# Altium footprint library Connectors THD.PcbLib: 631 footprints (part 15 of 46) (continued)
## HARTING_02 02 160 2301 [mm] "Backplane Connector; Har-bus 64, 17mm Pres-in Terminations; Rows z+a+b+c+d, Press-in 160 Female Contacts" (continued)
  text "d" at 6.475,-0.45 h1.2
  text "c" at 2.275,1.425 h1.2
  text "z" at -5.725,1.375 h1.2
  text "a" at -3.14,1.39 h1.2
  text "b" at -0.425,1.4 h1.2
  text "30" at -10.575,-74.3 h1.2
  text "25" at -10.625,-61.6 h1.2
  text "20" at -10.575,-48.875 h1.2
  text "15" at -10.395,-36.185 h1.2
  text "10" at -10.395,-23.485 h1.2
  text "5" at -9.525,-10.795 h1.2
  text "32" at -10.6,-79.375 h1.2
  text "1" at -9.07,-0.675 h1.2
Drill Drawing:
  lines w0.1: -7.62,-58.42 -7.62,-81.28 7.62,-81.28 7.62,2.54 -7.62,2.54 -7.62,-20.32
  text "PRESS-FIT TECHNOLOGY diam. 1mm +0.1 -0" at -6.985,-56.515 h1
3D body: height 11.6, standoff -17, extent -8,-86.82 8,8.08

## HARTING_02 04 160 1101 [mm] "PCB connector, DIN 41612, har-bus 64, 160 poles, Angled solder pins, 3.0 mm, Male contacts, Four first mating contacts, Performance level 2 as per IEC 60603-2, Row pitch: 2.54 mm, Without fixing"
height 10.7
pads (162):
  round 1.5 hole 1: a1(-2.54,-78.74) a2(-2.54,-76.2) a3(-2.54,-73.66) a4(-2.54,-71.12) a5(-2.54,-68.58) a6(-2.54,-66.04) a7(-2.54,-63.5) a8(-2.54,-60.96) a9(-2.54,-58.42) a10(-2.54,-55.88) a11(-2.54,-53.34) a12(-2.54,-50.8) a13(-2.54,-48.26) a14(-2.54,-45.72) a15(-2.54,-43.18) a16(-2.54,-40.64) a17(-2.54,-38.1) a18(-2.54,-35.56) a19(-2.54,-33.02) a20(-2.54,-30.48) a21(-2.54,-27.94) a22(-2.54,-25.4) a23(-2.54,-22.86) a24(-2.54,-20.32) a25(-2.54,-17.78) a26(-2.54,-15.24) a27(-2.54,-12.7) a28(-2.54,-10.16) a29(-2.54,-7.62) a30(-2.54,-5.08) a31(-2.54,-2.54) a32(-2.54,0) b1(-5.08,-78.74) b2(-5.08,-76.2) b3(-5.08,-73.66) b4(-5.08,-71.12) b5(-5.08,-68.58) b6(-5.08,-66.04) b7(-5.08,-63.5) b8(-5.08,-60.96) b9(-5.08,-58.42) b10(-5.08,-55.88) b11(-5.08,-53.34) b12(-5.08,-50.8) b13(-5.08,-48.26) b14(-5.08,-45.72) b15(-5.08,-43.18) b16(-5.08,-40.64) b17(-5.08,-38.1) b18(-5.08,-35.56) b19(-5.08,-33.02) b20(-5.08,-30.48) b21(-5.08,-27.94) b22(-5.08,-25.4) b23(-5.08,-22.86) b24(-5.08,-20.32) b25(-5.08,-17.78) b26(-5.08,-15.24) b27(-5.08,-12.7) b28(-5.08,-10.16) b29(-5.08,-7.62) b30(-5.08,-5.08) b31(-5.08,-2.54) b32(-5.08,0) c1(-7.62,-78.74) c2(-7.62,-76.2) c3(-7.62,-73.66) c4(-7.62,-71.12) c5(-7.62,-68.58) c6(-7.62,-66.04) c7(-7.62,-63.5) c8(-7.62,-60.96) c9(-7.62,-58.42) c10(-7.62,-55.88) c11(-7.62,-53.34) c12(-7.62,-50.8) c13(-7.62,-48.26) c14(-7.62,-45.72) c15(-7.62,-43.18) c16(-7.62,-40.64) c17(-7.62,-38.1) c18(-7.62,-35.56) c19(-7.62,-33.02) c20(-7.62,-30.48) c21(-7.62,-27.94) c22(-7.62,-25.4) c23(-7.62,-22.86) c24(-7.62,-20.32) c25(-7.62,-17.78) c26(-7.62,-15.24) c27(-7.62,-12.7) c28(-7.62,-10.16) c29(-7.62,-7.62) c30(-7.62,-5.08) c31(-7.62,-2.54) c32(-7.62,0) d1(-10.16,-78.74) d2(-10.16,-76.2) d3(-10.16,-73.66) d4(-10.16,-71.12) d5(-10.16,-68.58) d6(-10.16,-66.04) d7(-10.16,-63.5) d8(-10.16,-60.96) d9(-10.16,-58.42) d10(-10.16,-55.88) d11(-10.16,-53.34) d12(-10.16,-50.8) d13(-10.16,-48.26) d14(-10.16,-45.72) d15(-10.16,-43.18) d16(-10.16,-40.64) d17(-10.16,-38.1) d18(-10.16,-35.56) d19(-10.16,-33.02) d20(-10.16,-30.48) d21(-10.16,-27.94) d22(-10.16,-25.4) d23(-10.16,-22.86) d24(-10.16,-20.32) d25(-10.16,-17.78) d26(-10.16,-15.24) d27(-10.16,-12.7) d28(-10.16,-10.16) d29(-10.16,-7.62) d30(-10.16,-5.08) d31(-10.16,-2.54) d32(-10.16,0) z1(0,-78.74) z2(0,-76.2) z3(0,-73.66) z4(0,-71.12) z5(0,-68.58) z6(0,-66.04) z7(0,-63.5) z8(0,-60.96) z9(0,-58.42) z10(0,-55.88) z11(0,-53.34) z12(0,-50.8) z13(0,-48.26) z14(0,-45.72) z15(0,-43.18) z16(0,-40.64) z17(0,-38.1) z18(0,-35.56) z19(0,-33.02) z20(0,-30.48) z21(0,-27.94) z22(0,-25.4) z23(0,-22.86) z24(0,-20.32) z25(0,-17.78) z26(0,-15.24) z27(0,-12.7) z28(0,-10.16) z29(0,-7.62) z30(0,-5.08) z31(0,-2.54) z32(0,0)
  round 3.5 / inner round 3.5 / far side round 5.1 hole 2.8: MTG1(0,5.08) MTG2(0,-83.82)
Top Overlay:
  lines w0.2: -6.4,-83.82 -2.944,-83.82 ; -6.4,-80.77 -12.3,-80.77 -12.3,1.53 -6.4,1.53 ; -6.4,5.08 -2.944,5.08 ; -1.15,-86.27 -6.4,-86.27 -6.4,7.53 -1.15,7.53 ; 1.3,-86.27 ccw(c1.3,-84.67) 2.9,-84.67 2.9,-82.57 4.1,-81.37 4.1,-80.77 ; 1.3,7.53 cw(c1.3,5.93) 2.9,5.93 2.9,3.83 4.1,2.63 4.1,2.08 ; 3.7,-81.77 12.6,-81.77 12.6,3.03 3.7,3.03 ; 12.6,-80.77 1.25,-80.77 1.25,2.03 12.6,2.03
  text "d" at -10.795,2.262 h1.2
  text "z" at -0.35,1.317 h1.2
  text "a" at -2.921,1.317 h1.2
  text "b" at -5.461,1.317 h1.2
  text "c" at -8.128,2.262 h1.2
  text "30" at -15.005,-5.69 h1.2
  text "25" at -15.055,-18.39 h1.2
  text "20" at -15.005,-31.115 h1.2
  text "15" at -14.825,-43.805 h1.2
  text "10" at -14.825,-56.505 h1.2
  text "5" at -13.955,-69.195 h1.2
  text "32" at -15.03,-0.615 h1.2
  text "1" at -13.5,-79.315 h1.2
Mechanical 1:
  text "c" at -8.128,2.262 h1.2
  text "b" at -5.461,1.317 h1.2
  text "a" at -2.921,1.317 h1.2
  text "z" at -0.35,1.317 h1.2
  text "d" at -10.795,2.262 h1.2
Mechanical 8:
  drawing of 686 lines, arcs and shapes, not listed
  text "PCB" at 2.54,-41.275 h1.5
Mechanical 14:
  drawing of 224 lines, arcs and shapes, not listed
  text "30" at -15.005,-5.69 h1.2
  text "25" at -15.055,-18.39 h1.2
  text "20" at -15.005,-31.115 h1.2
  text "15" at -14.825,-43.805 h1.2
  text "10" at -14.825,-56.505 h1.2
  text "5" at -13.955,-69.195 h1.2
  text "32" at -15.03,-0.615 h1.2
  text "1" at -13.5,-79.315 h1.2
3D body: height 10.65, standoff -2.95, extent -12.3,-86.27 12.6,7.53

## HARTING_02 07 160 1101 [mm] "Extender Card Female Connector; Har-bus 64, 17mm Pres-in Terminations; Rows z+a+b+c+d, 160 Female Contacts"
height 11.95
pads (162):
  round 1.7 hole 1: a1(-2.54,-78.74) a2(-2.54,-76.2) a3(-2.54,-73.66) a4(-2.54,-71.12) a5(-2.54,-68.58) a6(-2.54,-66.04) a7(-2.54,-63.5) a8(-2.54,-60.96) a9(-2.54,-58.42) a10(-2.54,-55.88) a11(-2.54,-53.34) a12(-2.54,-50.8) a13(-2.54,-48.26) a14(-2.54,-45.72) a15(-2.54,-43.18) a16(-2.54,-40.64) a17(-2.54,-38.1) a18(-2.54,-35.56) a19(-2.54,-33.02) a20(-2.54,-30.48) a21(-2.54,-27.94) a22(-2.54,-25.4) a23(-2.54,-22.86) a24(-2.54,-20.32) a25(-2.54,-17.78) a26(-2.54,-15.24) a27(-2.54,-12.7) a28(-2.54,-10.16) a29(-2.54,-7.62) a30(-2.54,-5.08) a31(-2.54,-2.54) a32(-2.54,0) b1(-5.08,-78.74) b2(-5.08,-76.2) b3(-5.08,-73.66) b4(-5.08,-71.12) b5(-5.08,-68.58) b6(-5.08,-66.04) b7(-5.08,-63.5) b8(-5.08,-60.96) b9(-5.08,-58.42) b10(-5.08,-55.88) b11(-5.08,-53.34) b12(-5.08,-50.8) b13(-5.08,-48.26) b14(-5.08,-45.72) b15(-5.08,-43.18) b16(-5.08,-40.64) b17(-5.08,-38.1) b18(-5.08,-35.56) b19(-5.08,-33.02) b20(-5.08,-30.48) b21(-5.08,-27.94) b22(-5.08,-25.4) b23(-5.08,-22.86) b24(-5.08,-20.32) b25(-5.08,-17.78) b26(-5.08,-15.24) b27(-5.08,-12.7) b28(-5.08,-10.16) b29(-5.08,-7.62) b30(-5.08,-5.08) b31(-5.08,-2.54) b32(-5.08,0) c1(-7.62,-78.74) c2(-7.62,-76.2) c3(-7.62,-73.66) c4(-7.62,-71.12) c5(-7.62,-68.58) c6(-7.62,-66.04) c7(-7.62,-63.5) c8(-7.62,-60.96) c9(-7.62,-58.42) c10(-7.62,-55.88) c11(-7.62,-53.34) c12(-7.62,-50.8) c13(-7.62,-48.26) c14(-7.62,-45.72) c15(-7.62,-43.18) c16(-7.62,-40.64) c17(-7.62,-38.1) c18(-7.62,-35.56) c19(-7.62,-33.02) c20(-7.62,-30.48) c21(-7.62,-27.94) c22(-7.62,-25.4) c23(-7.62,-22.86) c24(-7.62,-20.32) c25(-7.62,-17.78) c26(-7.62,-15.24) c27(-7.62,-12.7) c28(-7.62,-10.16) c29(-7.62,-7.62) c30(-7.62,-5.08) c31(-7.62,-2.54) c32(-7.62,0) d1(-10.16,-78.74) d2(-10.16,-76.2) d3(-10.16,-73.66) d4(-10.16,-71.12) d5(-10.16,-68.58) d6(-10.16,-66.04) d7(-10.16,-63.5) d8(-10.16,-60.96) d9(-10.16,-58.42) d10(-10.16,-55.88) d11(-10.16,-53.34) d12(-10.16,-50.8) d13(-10.16,-48.26) d14(-10.16,-45.72) d15(-10.16,-43.18) d16(-10.16,-40.64) d17(-10.16,-38.1) d18(-10.16,-35.56) d19(-10.16,-33.02) d20(-10.16,-30.48) d21(-10.16,-27.94) d22(-10.16,-25.4) d23(-10.16,-22.86) d24(-10.16,-20.32) d25(-10.16,-17.78) d26(-10.16,-15.24) d27(-10.16,-12.7) d28(-10.16,-10.16) d29(-10.16,-7.62) d30(-10.16,-5.08) d31(-10.16,-2.54) d32(-10.16,0) z1(0,-78.74) z2(0,-76.2) z3(0,-73.66) z4(0,-71.12) z5(0,-68.58) z6(0,-66.04) z7(0,-63.5) z8(0,-60.96) z9(0,-58.42) z10(0,-55.88) z11(0,-53.34) z12(0,-50.8) z13(0,-48.26) z14(0,-45.72) z15(0,-43.18) z16(0,-40.64) z17(0,-38.1) z18(0,-35.56) z19(0,-33.02) z20(0,-30.48) z21(0,-27.94) z22(0,-25.4) z23(0,-22.86) z24(0,-20.32) z25(0,-17.78) z26(0,-15.24) z27(0,-12.7) z28(0,-10.16) z29(0,-7.62) z30(0,-5.08) z31(0,-2.54) z32(0,0)
  round 3.5 / inner round 3.5 / far side round 5.1 hole 2.8: MTG1(0,5.08) MTG2(0,-83.82)
Top Overlay:
  lines w0.2: -6.4,-83.82 -2.944,-83.82 -2.652,-83.314 ; -6.4,-80.77 -6.4,-86.37 -0.887,-86.37 ; -6.4,1.53 -6.4,7.63 -0.887,7.63 ; -6.4,5.08 -2.944,5.08 -2.652,4.574 ; -1.765,-81.777 -1.472,-81.27 -0.887,-81.27 ; -1.765,3.036 -1.472,2.53 -0.887,2.53 ; 0.887,-86.37 12.6,-86.37 ; 0.887,-81.27 1.472,-81.27 1.765,-81.777 ; 0.887,2.53 1.472,2.53 1.765,3.036 ; 0.887,7.63 12.6,7.63 ; 1.25,-80.77 1.25,2.03 12.6,2.03 ; 1.25,1.53 -12.6,1.53 -12.6,-80.77 12.6,-80.77 ; 2.579,-83.02 2.9,-83.02 2.9,-82.57 4.1,-81.37 4.1,-80.77 ; 2.579,4.28 2.9,4.28 2.9,3.83 4.1,2.63 4.1,2.03 ; 12,-80.77 12,2.03 ; 12.6,-81.87 25.57,-81.87 26.2,-81.24 26.2,2.5 25.57,3.13 12.6,3.13 ; 14.6,-86.67 12.6,-86.67 12.6,7.93 14.6,7.93 ; 15.1,-81.87 15.1,3.13 ; 16.55,-81.87 16.55,3.13 ; 18.5,-82.27 18.504,-82.27 cw(c18.504,-82.97) 19.204,-82.97 19.204,-84.37 ; 18.5,-81.87 18.5,-84.37 19.65,-84.37 19.65,-86.82 14.6,-86.82 14.6,8.08 19.65,8.08 19.65,5.63 18.5,5.63 18.5,3.13 ; 18.503,3.53 ccw(c18.503,4.23) 19.203,4.23 19.203,5.63 ; 25.9,-81.54 25.9,2.8
  text "d" at -10.705,2.175 h1.2
  text "c" at -8.13,2.2 h1.2
  text "1" at -13.8,-79.315 h1.2
  text "a" at -3.365,2.215 h1.2
  text "b" at -5.53,2.225 h1.2
  text "32" at -15.33,-0.615 h1.2
  text "5" at -14.255,-69.195 h1.2
  text "10" at -15.125,-56.505 h1.2
  text "15" at -15.125,-43.805 h1.2
  text "20" at -15.305,-31.115 h1.2
  text "25" at -15.355,-18.39 h1.2
  text "30" at -15.305,-5.69 h1.2
Mechanical 8:
  lines w0.1: -10.66,-78.74 -10.16,-78.74 ; -10.66,0 -10.16,0 ; -10.16,-79.24 -10.16,-78.74 ; -10.16,-78.24 -10.16,-78.74 ; -10.16,-0.5 -10.16,0 ; -10.16,0.5 -10.16,0 ; -9.66,-78.74 -10.16,-78.74 ; -9.66,0 -10.16,0 ; -8.12,-78.74 -7.62,-78.74 ; -8.12,0 -7.62,0 ; -7.62,-79.24 -7.62,-78.74 ; -7.62,-78.24 -7.62,-78.74 ; -7.62,-0.5 -7.62,0 ; -7.62,0.5 -7.62,0 ; -7.12,-78.74 -7.62,-78.74 ; -7.12,0 -7.62,0 ; -5.58,-78.74 -5.08,-78.74 ; -5.58,0 -5.08,0 ; -5.434,-39.724 -5.08,-39.37 ; -5.434,-39.016 -5.08,-39.37 ; -5.08,-79.24 -5.08,-78.74 ; -5.08,-78.24 -5.08,-78.74 ; -5.08,-0.5 -5.08,0 ; -5.08,0.5 -5.08,0 ; -4.726,-39.724 -5.08,-39.37 ; -4.726,-39.016 -5.08,-39.37 ; -4.58,-78.74 -5.08,-78.74 ; -4.58,0 -5.08,0 ; -3.04,-78.74 -2.54,-78.74 ; -3.04,0 -2.54,0 ; -2.54,-79.24 -2.54,-78.74 ; -2.54,-78.24 -2.54,-78.74 ; -2.54,-0.5 -2.54,0 ; -2.54,0.5 -2.54,0 ; -2.04,-78.74 -2.54,-78.74 ; -2.04,0 -2.54,0 ; -0.5,-83.82 0,-83.82 ; -0.5,-78.74 0,-78.74 ; -0.5,0 0,0 ; -0.5,5.08 0,5.08 ; 0,-84.32 0,-83.82 ; 0,-83.32 0,-83.82 ; 0,-79.24 0,-78.74 ; 0,-78.24 0,-78.74 ; 0,-0.5 0,0 ; 0,0.5 0,0 ; 0,4.58 0,5.08 ; 0,5.58 0,5.08 ; 0.5,-83.82 0,-83.82 ; 0.5,-78.74 0,-78.74 ; 0.5,0 0,0 ; 0.5,5.08 0,5.08 ; 2.76,-88.82 2.76,-39.37 2.76,10.08
Mechanical 14:
  circle w0.1: c0,-83.82 r1.25
  circle w0.1: c0,5.08 r1.25
  lines w0.1: -6.4,-83.82 -2.944,-83.82 -1.472,-81.27 1.472,-81.27 2.483,-83.02 2.9,-83.02 2.9,-82.57 4.1,-81.37 4.1,-80.77 ; -6.4,5.08 -2.944,5.08 -1.472,2.53 1.472,2.53 2.483,4.28 2.9,4.28 2.9,3.83 4.1,2.63 4.1,2.03 ; 1.25,-80.77 1.25,2.03 12.6,2.03 ; 1.25,1.53 -12.6,1.53 -12.6,-80.77 12.6,-80.77 ; 12,-80.77 12,2.03 ; 12.6,-86.37 -6.4,-86.37 -6.4,7.63 12.6,7.63 ; 12.6,-81.87 25.57,-81.87 26.2,-81.24 26.2,2.5 25.57,3.13 12.6,3.13 ; 14.6,-86.67 12.6,-86.67 12.6,7.93 14.6,7.93 ; 15.1,-81.87 15.1,3.13 ; 16.55,-81.87 16.55,3.13 ; 18.5,-82.27 18.504,-82.27 cw(c18.504,-82.97) 19.204,-82.97 19.204,-84.37 ; 18.5,-81.87 18.5,-84.37 19.65,-84.37 19.65,-86.82 14.6,-86.82 14.6,8.08 19.65,8.08 19.65,5.63 18.5,5.63 18.5,3.13 ; 18.503,3.53 ccw(c18.503,4.23) 19.203,4.23 19.203,5.63 ; 25.9,-81.54 25.9,2.8
  text "d" at -10.705,2.175 h1.2
  text "c" at -8.13,2.2 h1.2
  text "1" at -13.8,-79.315 h1.2
  text "z" at 1.7,-0.375 h1.2
  text "a" at -3.365,2.215 h1.2
  text "b" at -5.53,2.225 h1.2
  text "32" at -15.33,-0.615 h1.2
  text "5" at -14.255,-69.195 h1.2
  text "10" at -15.125,-56.505 h1.2
  text "15" at -15.125,-43.805 h1.2
  text "20" at -15.305,-31.115 h1.2
  text "25" at -15.355,-18.39 h1.2
  text "30" at -15.305,-5.69 h1.2
3D body: height 11.95, standoff -4.05, extent -12.6,-86.82 26.2,8.08

## HARTING_02 44 000 0001 [mm] "Backplane Connector; Har-bus 64, Thru-Hole; Rows z+a+b+c+d, Press-in 160 Female Contacts"
height 15.5
Top Overlay:
  lines w0.2: -7.7,-78.72 -6.9,-78.72 ; -7.7,-0.02 -6.9,-0.02 ; -4.55,3.23 -4.55,8.13 ; -3,-86.87 -3,-79.27 2.4,-79.27 2.4,-86.87 ; -3,-86.289 -3.712,-86.289 -3.712,-83.451 -3,-83.451 ; -3,-81.97 -6.9,-81.97 -6.9,3.23 -3,3.23 ; -3,2.54 -3,8.13 ; -3,4.711 -3.712,4.711 -3.712,7.549 -3,7.549 ; -1.905,-86.87 -7.7,-86.87 -7.7,8.13 -1.905,8.13 ; 1.905,-86.87 7.7,-86.87 7.7,8.13 1.905,8.13 ; 2.4,-86.289 3.112,-86.289 3.109,-83.453 2.4,-83.451 ; 2.4,-81.97 4.4,-81.97 4.4,-80.97 6.9,-80.97 6.9,2.23 6.5,2.23 ; 2.4,2.54 2.4,8.13 ; 2.4,3.23 4.4,3.23 4.4,2.23 ; 2.4,4.711 3.112,4.711 3.103,7.541 2.4,7.541 ; 3.95,3.23 3.95,8.13 ; 6.9,-78.72 7.7,-78.72 ; 6.9,-0.02 7.7,-0.02
  text "30" at -10.575,-74.3 h1.2
  text "25" at -10.625,-61.6 h1.2
  text "20" at -10.575,-48.875 h1.2
  text "15" at -10.395,-36.185 h1.2
  text "10" at -10.395,-23.485 h1.2
  text "5" at -9.525,-10.795 h1.2
  text "32" at -10.6,-79.375 h1.2
  text "1" at -9.07,-0.675 h1.2
  text "z" at 5.15,1.175 h1.2
  text "a" at 2.275,1.2 h1.2
  text "d" at -5.725,1.15 h1.2
  text "c" at -3.14,1.165 h1.2
  text "b" at -0.425,1.175 h1.2
Mechanical 8:
  lines w0.1: -1.3,-84.37 -0.3,-84.37 ; -1.3,5.63 -0.3,5.63 ; -0.5,0 0,0 ; -0.3,-85.37 -0.3,-84.37 ; -0.3,-83.37 -0.3,-84.37 ; -0.3,4.63 -0.3,5.63 ; -0.3,6.63 -0.3,5.63 ; 0,-0.5 0,0 ; 0,0.5 0,0 ; 0.5,0 0,0 ; 0.7,-84.37 -0.3,-84.37 ; 0.7,5.63 -0.3,5.63
Mechanical 14:
  lines w0.1: -7.7,-78.72 -6.9,-78.72 ; -7.7,-0.02 -6.9,-0.02 ; -4.55,3.23 -4.55,8.13 ; -3,-86.87 -3,-79.27 2.4,-79.27 2.4,-86.87 ; -3,-86.289 -3.712,-86.289 -3.712,-83.451 -3,-83.451 ; -3,-81.97 -6.9,-81.97 -6.9,3.23 -3,3.23 ; -3,4.711 -3.712,4.711 -3.712,7.549 -3,7.549 ; -3,7.13 2.4,7.13 ; -3,8.13 -3,0.53 2.4,0.53 2.4,8.13 ; 2.4,-86.289 3.112,-86.289 3.109,-83.453 2.4,-83.451 ; 2.4,-81.97 4.4,-81.97 4.4,-80.97 6.9,-80.97 6.9,2.23 4.4,2.23 4.4,3.23 2.4,3.23 ; 2.4,4.711 3.112,4.711 3.103,7.541 2.4,7.541 ; 3.95,3.23 3.95,8.13 ; 6.9,-78.72 7.7,-78.72 ; 6.9,-0.02 7.7,-0.02 ; -7.7,-86.87 -7.7,8.13 7.7,8.13 7.7,-86.87 -7.7,-86.87
  text "b" at -0.425,1.175 h1.2
  text "c" at -3.14,1.165 h1.2
  text "d" at -5.725,1.15 h1.2
  text "a" at 2.275,1.2 h1.2
  text "z" at 5.15,1.175 h1.2
  text "1" at -9.07,-0.675 h1.2
  text "32" at -10.6,-79.375 h1.2
  text "5" at -9.525,-10.795 h1.2
  text "10" at -10.395,-23.485 h1.2
  text "15" at -10.395,-36.185 h1.2
  text "20" at -10.575,-48.875 h1.2
  text "25" at -10.625,-61.6 h1.2
  text "30" at -10.575,-74.3 h1.2
3D body: height 15.5, standoff 0, extent -7.7,-86.87 7.7,8.13

## HARTING_09 02 164 2921 [mm] "Connector; DIN 41612, Type B, Thru-Hole; Rows a+b, 64 Position; Right Angle"
height 8.5
pads (66):
  round 1.7 hole 1: a1(0,0) a2(0,-2.54) a3(0,-5.08) a4(0,-7.62) a5(0,-10.16) a6(0,-12.7) a7(0,-15.24) a8(0,-17.78) a9(0,-20.32) a10(0,-22.86) a11(0,-25.4) a12(0,-27.94) a13(0,-30.48) a14(0,-33.02) a15(0,-35.56) a16(0,-38.1) a17(0,-40.64) a18(0,-43.18) a19(0,-45.72) a20(0,-48.26) a21(0,-50.8) a22(0,-53.34) a23(0,-55.88) a24(0,-58.42) a25(0,-60.96) a26(0,-63.5) a27(0,-66.04) a28(0,-68.58) a29(0,-71.12) a30(0,-73.66) a31(0,-76.2) a32(0,-78.74) b1(-2.54,0) b2(-2.54,-2.54) b3(-2.54,-5.08) b4(-2.54,-7.62) b5(-2.54,-10.16) b6(-2.54,-12.7) b7(-2.54,-15.24) b8(-2.54,-17.78) b9(-2.54,-20.32) b10(-2.54,-22.86) b11(-2.54,-25.4) b12(-2.54,-27.94) b13(-2.54,-30.48) b14(-2.54,-33.02) b15(-2.54,-35.56) b16(-2.54,-38.1) b17(-2.54,-40.64) b18(-2.54,-43.18) b19(-2.54,-45.72) b20(-2.54,-48.26) b21(-2.54,-50.8) b22(-2.54,-53.34) b23(-2.54,-55.88) b24(-2.54,-58.42) b25(-2.54,-60.96) b26(-2.54,-63.5) b27(-2.54,-66.04) b28(-2.54,-68.58) b29(-2.54,-71.12) b30(-2.54,-73.66) b31(-2.54,-76.2) b32(-2.54,-78.74)
  round 3.5 / inner round 3.5 / far side round 5.1 hole 2.8: MTG1(2.54,5.08) MTG2(2.54,-83.82)
Top Overlay:
  drawing of 227 lines, arcs and shapes, not listed
  text "1" at -4.505,-0.725 h1.2
  text "b" at -2.65,2.025 h1.2
  text "a" at -0.95,1.99 h1.2
  text "32" at -5.955,-79.365 h1.2
  text "5" at -4.855,-10.785 h1.2
  text "10" at -5.83,-23.535 h1.2
  text "15" at -5.83,-36.235 h1.2
  text "20" at -6.055,-48.81 h1.2
  text "25" at -6,-61.575 h1.2
  text "30" at -5.98,-74.285 h1.2
Mechanical 8:
  lines w0.1: -5.08,-39.37 12.64,-39.37 ; 5.3,-86.3 5.3,7.5
  text "PCB" at 5.08,-41.275 h1.2
Mechanical 14:
  drawing of 161 lines, arcs and shapes, not listed
  text "a" at -0.95,1.99 h1.2
  text "b" at -2.65,2.025 h1.2
  text "32" at -5.955,-79.365 h1.2
  text "10" at -5.83,-23.535 h1.2
  text "20" at -6.055,-48.81 h1.2
  text "30" at -5.98,-74.285 h1.2
  text "1" at -4.505,-0.725 h1.2
  text "5" at -4.855,-10.785 h1.2
3D body: height 6.83, standoff -3, extent -2.838,-86.37 12.642,7.63

## HARTING_09 02 264 6825 [mm] "DIN 41612, Type B, Thru-Hole; Rows a+b, 64 Position, Straight Female Connector"
height 11.6
pads (66):
  round 1.7 hole 1: a1(0,0) a2(0,-2.54) a3(0,-5.08) a4(0,-7.62) a5(0,-10.16) a6(0,-12.7) a7(0,-15.24) a8(0,-17.78) a9(0,-20.32) a10(0,-22.86) a11(0,-25.4) a12(0,-27.94) a13(0,-30.48) a14(0,-33.02) a15(0,-35.56) a16(0,-38.1) a17(0,-40.64) a18(0,-43.18) a19(0,-45.72) a20(0,-48.26) a21(0,-50.8) a22(0,-53.34) a23(0,-55.88) a24(0,-58.42) a25(0,-60.96) a26(0,-63.5) a27(0,-66.04) a28(0,-68.58) a29(0,-71.12) a30(0,-73.66) a31(0,-76.2) a32(0,-78.74) b1(2.54,0) b2(2.54,-2.54) b3(2.54,-5.08) b4(2.54,-7.62) b5(2.54,-10.16) b6(2.54,-12.7) b7(2.54,-15.24) b8(2.54,-17.78) b9(2.54,-20.32) b10(2.54,-22.86) b11(2.54,-25.4) b12(2.54,-27.94) b13(2.54,-30.48) b14(2.54,-33.02) b15(2.54,-35.56) b16(2.54,-38.1) b17(2.54,-40.64) b18(2.54,-43.18) b19(2.54,-45.72) b20(2.54,-48.26) b21(2.54,-50.8) b22(2.54,-53.34) b23(2.54,-55.88) b24(2.54,-58.42) b25(2.54,-60.96) b26(2.54,-63.5) b27(2.54,-66.04) b28(2.54,-68.58) b29(2.54,-71.12) b30(2.54,-73.66) b31(2.54,-76.2) b32(2.54,-78.74)
  round 3.5 / inner round 3.5 / far side round 5.1 hole 2.8: MTG1(2.24,5.63) MTG2(2.24,-84.37)
Top Overlay:
  lines w0.2: -2.73,-84.37 -0.71,-84.37 ; -2.73,5.63 -0.71,5.63 ; -1.08,-79.8 -1.08,-81.22 ; -1.08,1.06 -1.08,2.48 ; -0.71,-86.82 -0.71,-83.82 0.416,-81.87 ; -0.71,8.08 -0.71,5.08 0.416,3.13 ; 1.275,-86.82 -2.73,-86.82 -2.73,8.08 1.275,8.08 ; 3.2,-86.82 5.27,-86.82 5.27,8.08 3.2,8.08 ; 3.62,-79.375 3.62,-80.17 ; 3.62,0.635 3.62,1.43 ; 4.693,-82.82 5.27,-82.82 ; 4.693,4.075 5.27,4.075 ; -1.73,-81.87 -1.08,-81.22 ; -1.73,-81.87 -1.73,3.13 ; -1.73,-81.87 1.17,-81.87 ; -1.73,3.13 -1.08,2.48 ; -1.73,3.13 1.17,3.13 ; -1.08,-81.22 0.52,-81.22 ; -1.08,2.48 0.52,2.48 ; 0.52,-81.22 1.17,-81.87 ; 0.52,-81.22 0.52,-80.17 ; 0.52,-80.17 1.17,-80.82 ; 0.52,-80.17 3.62,-80.17 ; 0.52,1.43 1.17,2.08 ; 0.52,1.43 0.52,2.48 ; 0.52,1.43 3.62,1.43 ; 0.52,2.48 1.17,3.13 ; 1.17,-81.87 1.17,-80.82 ; 1.17,-80.82 4.27,-80.82 ; 1.17,2.08 4.27,2.08 ; 1.17,2.08 1.17,3.13 ; 3.62,-80.17 4.27,-80.82 ; 3.62,1.43 4.27,2.08 ; 4.27,-80.82 4.27,2.08
  text "b" at 5.945,-0.574 h1.2
  text "a" at -2.001,3.81 h1.2
  text "32" at -5.575,-79.44 h1.2
  text "5" at -4.35,-10.91 h1.2
  text "10" at -5.275,-23.56 h1.2
  text "30" at -5.575,-74.36 h1.2
  text "25" at -5.575,-61.66 h1.2
  text "20" at -5.575,-48.96 h1.2
  text "15" at -5.275,-36.26 h1.2
  text "1" at -4.15,-0.75 h1.2
Mechanical 8:
  drawing of 262 lines, arcs and shapes, not listed
Mechanical 14:
  lines w0.1: -2.73,-84.37 -0.71,-84.37 ; -2.73,5.63 -0.71,5.63 ; -0.71,-86.82 -0.71,-83.82 0.416,-81.87 ; -0.71,8.08 -0.71,5.08 0.416,3.13 ; 5.27,-82.82 4.693,-82.82 4.144,-81.87 -1.73,-81.87 ; 5.27,4.08 4.693,4.08 4.144,3.13 -1.73,3.13 ; -1.73,-81.87 -1.08,-81.22 ; -1.73,-81.87 -1.73,3.13 ; -1.73,3.13 -1.08,2.48 ; -1.08,-81.22 -1.08,2.48 ; -1.08,-81.22 0.52,-81.22 ; -1.08,2.48 0.52,2.48 ; 0.52,-81.22 1.17,-81.87 1.17,-80.82 ; 0.52,-81.22 0.52,-80.17 ; 0.52,-80.17 1.17,-80.82 ; 0.52,-80.17 3.62,-80.17 ; 0.52,1.43 1.17,2.08 ; 0.52,1.43 0.52,2.48 ; 0.52,1.43 3.62,1.43 ; 0.52,2.48 1.17,3.13 1.17,2.08 ; 1.17,-80.82 4.27,-80.82 ; 1.17,2.08 4.27,2.08 ; 3.62,-80.17 4.27,-80.82 ; 3.62,-80.17 3.62,1.43 ; 3.62,1.43 4.27,2.08 ; 4.27,-80.82 4.27,2.08 ; -2.73,-86.82 -2.73,8.08 5.27,8.08 5.27,-86.82 -2.73,-86.82
  text "1" at -4.15,-0.75 h1.2
  text "b" at 5.945,-0.574 h1.2
  text "a" at -2.001,3.81 h1.2
  text "32" at -5.575,-79.44 h1.2
  text "5" at -4.35,-10.91 h1.2
  text "10" at -5.275,-23.56 h1.2
  text "15" at -5.275,-36.26 h1.2
  text "20" at -5.575,-48.96 h1.2
  text "25" at -5.575,-61.66 h1.2
  text "30" at -5.575,-74.36 h1.2
3D body: height 11.6, standoff -4.5, extent -2.73,-86.82 5.27,8.08

## HARTING_09 02 264 6850 [mm] "DIN 41612, Type B, Thru-Hole Press-in; Rows a+b, 64 Position, Straight Female Connector"
height 11.6
pads (66):
  round 1.7 hole 1: a1(0,0) a2(0,-2.54) a3(0,-5.08) a4(0,-7.62) a5(0,-10.16) a6(0,-12.7) a7(0,-15.24) a8(0,-17.78) a9(0,-20.32) a10(0,-22.86) a11(0,-25.4) a12(0,-27.94) a13(0,-30.48) a14(0,-33.02) a15(0,-35.56) a16(0,-38.1) a17(0,-40.64) a18(0,-43.18) a19(0,-45.72) a20(0,-48.26) a21(0,-50.8) a22(0,-53.34) a23(0,-55.88) a24(0,-58.42) a25(0,-60.96) a26(0,-63.5) a27(0,-66.04) a28(0,-68.58) a29(0,-71.12) a30(0,-73.66) a31(0,-76.2) a32(0,-78.74) b1(2.54,0) b2(2.54,-2.54) b3(2.54,-5.08) b4(2.54,-7.62) b5(2.54,-10.16) b6(2.54,-12.7) b7(2.54,-15.24) b8(2.54,-17.78) b9(2.54,-20.32) b10(2.54,-22.86) b11(2.54,-25.4) b12(2.54,-27.94) b13(2.54,-30.48) b14(2.54,-33.02) b15(2.54,-35.56) b16(2.54,-38.1) b17(2.54,-40.64) b18(2.54,-43.18) b19(2.54,-45.72) b20(2.54,-48.26) b21(2.54,-50.8) b22(2.54,-53.34) b23(2.54,-55.88) b24(2.54,-58.42) b25(2.54,-60.96) b26(2.54,-63.5) b27(2.54,-66.04) b28(2.54,-68.58) b29(2.54,-71.12) b30(2.54,-73.66) b31(2.54,-76.2) b32(2.54,-78.74)
  round 3.5 / inner round 3.5 / far side round 5.1 hole 2.8: MTG1(2.24,5.63) MTG2(2.24,-84.37)
Top Overlay:
  lines w0.2: -2.73,-84.37 -0.71,-84.37 ; -2.73,5.63 -0.71,5.63 ; -1.08,-79.8 -1.08,-81.22 ; -1.08,1.06 -1.08,2.48 ; -0.71,-86.82 -0.71,-83.82 0.416,-81.87 ; -0.71,8.08 -0.71,5.08 0.416,3.13 ; 1.275,-86.82 -2.73,-86.82 -2.73,8.08 1.275,8.08 ; 3.2,-86.82 5.27,-86.82 5.27,8.08 3.2,8.08 ; 3.62,-79.375 3.62,-80.17 ; 3.62,0.635 3.62,1.43 ; 4.693,-82.82 5.27,-82.82 ; 4.693,4.075 5.27,4.075 ; -1.73,-81.87 1.17,-81.87 ; -1.73,-81.87 -1.73,3.13 ; -1.73,-81.87 -1.08,-81.22 ; -1.73,3.13 1.17,3.13 ; -1.73,3.13 -1.08,2.48 ; -1.08,-81.22 0.52,-81.22 ; -1.08,2.48 0.52,2.48 ; 0.52,-81.22 0.52,-80.17 ; 0.52,-81.22 1.17,-81.87 ; 0.52,-80.17 3.62,-80.17 ; 0.52,-80.17 1.17,-80.82 ; 0.52,1.43 3.62,1.43 ; 0.52,1.43 0.52,2.48 ; 0.52,1.43 1.17,2.08 ; 0.52,2.48 1.17,3.13 ; 1.17,-81.87 1.17,-80.82 ; 1.17,-80.82 4.27,-80.82 ; 1.17,2.08 1.17,3.13 ; 1.17,2.08 4.27,2.08 ; 3.62,-80.17 4.27,-80.82 ; 3.62,1.43 4.27,2.08 ; 4.27,-80.82 4.27,2.08
  text "a" at -2.051,3.86 h1.2
  text "1" at -4.175,-0.75 h1.2
  text "15" at -5.3,-36.26 h1.2
  text "20" at -5.6,-48.96 h1.2
  text "25" at -5.6,-61.66 h1.2
  text "30" at -5.6,-74.36 h1.2
  text "10" at -5.3,-23.56 h1.2
  text "5" at -4.375,-10.91 h1.2
  text "32" at -5.6,-79.44 h1.2
Mechanical 8:
  drawing of 262 lines, arcs and shapes, not listed
Mechanical 14:
  lines w0.1: -2.73,-84.37 -0.71,-84.37 ; -2.73,5.63 -0.71,5.63 ; -0.71,-86.82 -0.71,-83.82 0.416,-81.87 ; -0.71,8.08 -0.71,5.08 0.416,3.13 ; 5.27,-82.82 4.693,-82.82 4.144,-81.87 -1.73,-81.87 ; 5.27,4.08 4.693,4.08 4.144,3.13 -1.73,3.13 ; -1.73,-81.87 -1.73,3.13 ; -1.73,-81.87 -1.08,-81.22 ; -1.73,3.13 -1.08,2.48 ; -1.08,-81.22 0.52,-81.22 ; -1.08,-81.22 -1.08,2.48 ; -1.08,2.48 0.52,2.48 ; 0.52,-81.22 0.52,-80.17 ; 0.52,-81.22 1.17,-81.87 1.17,-80.82 ; 0.52,-80.17 3.62,-80.17 ; 0.52,-80.17 1.17,-80.82 ; 0.52,1.43 3.62,1.43 ; 0.52,1.43 0.52,2.48 ; 0.52,1.43 1.17,2.08 ; 0.52,2.48 1.17,3.13 1.17,2.08 ; 1.17,-80.82 4.27,-80.82 ; 1.17,2.08 4.27,2.08 ; 3.62,-80.17 3.62,1.43 ; 3.62,-80.17 4.27,-80.82 ; 3.62,1.43 4.27,2.08 ; 4.27,-80.82 4.27,2.08 ; -2.73,-86.82 5.27,-86.82 5.27,8.08 -2.73,8.08 -2.73,-86.82
  text "a" at -2.051,3.86 h1.2
  text "30" at -5.6,-74.36 h1.2
  text "25" at -5.6,-61.66 h1.2
  text "20" at -5.6,-48.96 h1.2
  text "15" at -5.3,-36.26 h1.2
  text "10" at -5.3,-23.56 h1.2
  text "5" at -4.375,-10.91 h1.2
  text "32" at -5.6,-79.44 h1.2
  text "1" at -4.175,-0.75 h1.2
Drill Drawing:
  lines w0.1: -1.83,-59.13 -1.83,-80.17 4.25,-80.17 4.25,1.43 -1.73,1.43 -1.73,-21.03
  text "PRESS-FIT TECHNOLOGY diam. 1mm +0.1 -0" at -1.315,-57.225 h1
3D body: height 11.6, standoff -4.5, extent -2.73,-86.82 5.27,8.08